# Altium footprint library Package_DFN_QFN.PcbLib: 557 footprints (part 5 of 35)
Each footprint in its own frame and in the unit in brackets; x right, y up, seen from the top. Pads: shape width x height; smd on the part's side, far side on the other; paste and mask are expansions set on the pad; w line width, h text height; cw(c..) or ccw(c..) is an arc to the next point about the centre after c.
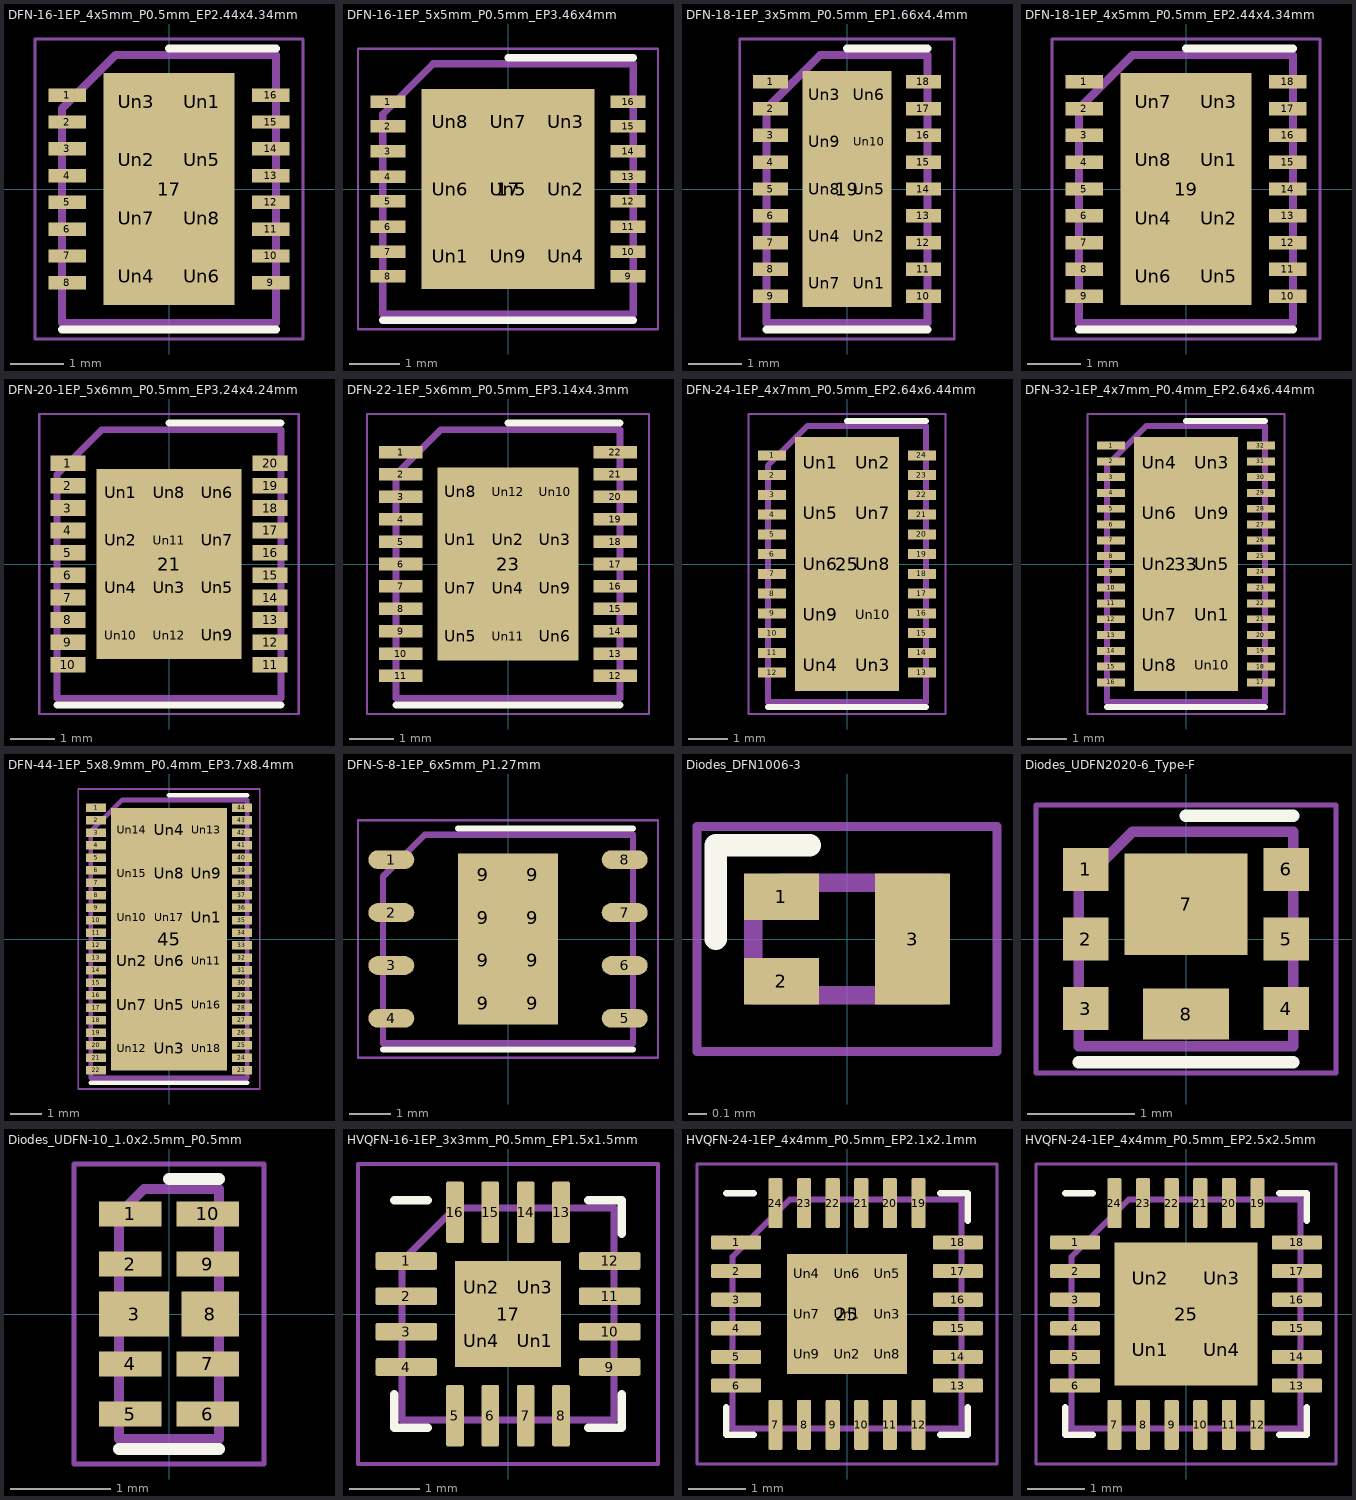
[diagram p4: the footprints below, top view; thin cyan lines are the x and y axes]

## DFN-16-1EP_4x5mm_P0.5mm_EP2.44x4.34mm [mm]
pads (25):
  rect 0.7x0.25 smd: 1(-1.9,1.75) 2(-1.9,1.25) 3(-1.9,0.75) 4(-1.9,0.25) 5(-1.9,-0.25) 6(-1.9,-0.75) 7(-1.9,-1.25) 8(-1.9,-1.75) 9(1.9,-1.75) 10(1.9,-1.25) 11(1.9,-0.75) 12(1.9,-0.25) 13(1.9,0.25) 14(1.9,0.75) 15(1.9,1.25) 16(1.9,1.75)
  rect 2.44x4.34 smd: 17(0,0)
  rect 1x0.86 on Top Paste: Un1(0.61,1.627) Un2(-0.61,0.543) Un3(-0.61,1.627) Un4(-0.61,-1.627) Un5(0.61,0.543) Un6(0.61,-1.627) Un7(-0.61,-0.543) Un8(0.61,-0.543)
F.SilkS:
  lines w0.15: -2,-2.625 2,-2.625 ; 0,2.625 2,2.625
F.CrtYd:
  lines w0.05: -2.5,-2.8 -2.5,2.8 2.5,2.8 2.5,-2.8 -2.5,-2.8
F.Fab:
  lines w0.15: -2,-2.5 -2,1.5 -1,2.5 2,2.5 2,-2.5 -2,-2.5
  text "'.Designator'" at -4.047,-0.84 h1

## DFN-16-1EP_5x5mm_P0.5mm_EP3.46x4mm [mm]
pads (26):
  rect 0.7x0.25 smd: 1(-2.4,1.75) 2(-2.4,1.25) 3(-2.4,0.75) 4(-2.4,0.25) 5(-2.4,-0.25) 6(-2.4,-0.75) 7(-2.4,-1.25) 8(-2.4,-1.75) 9(2.4,-1.75) 10(2.4,-1.25) 11(2.4,-0.75) 12(2.4,-0.25) 13(2.4,0.25) 14(2.4,0.75) 15(2.4,1.25) 16(2.4,1.75)
  rect 3.46x4 smd: 17(0,0)
  rect 0.9x1.1 on Top Paste: Un1(-1.154,-1.34) Un2(1.154,0) Un3(1.154,1.34) Un4(1.154,-1.34) Un5(0,0) Un6(-1.154,0) Un7(0,1.34) Un8(-1.154,1.34) Un9(0,-1.34)
F.SilkS:
  lines w0.15: -2.5,-2.625 2.5,-2.625 ; 0,2.625 2.5,2.625
F.CrtYd:
  lines w0.05: -3,-2.8 -3,2.8 3,2.8 3,-2.8 -3,-2.8
F.Fab:
  lines w0.15: -2.5,-2.5 -2.5,1.5 -1.5,2.5 2.5,2.5 2.5,-2.5 -2.5,-2.5
  text "'.Designator'" at -4.047,-0.84 h1

## DFN-18-1EP_3x5mm_P0.5mm_EP1.66x4.4mm [mm]
pads (29):
  rect 0.65x0.25 smd: 1(-1.425,2) 2(-1.425,1.5) 3(-1.425,1) 4(-1.425,0.5) 5(-1.425,0) 6(-1.425,-0.5) 7(-1.425,-1) 8(-1.425,-1.5) 9(-1.425,-2) 10(1.425,-2) 11(1.425,-1.5) 12(1.425,-1) 13(1.425,-0.5) 14(1.425,0) 15(1.425,0.5) 16(1.425,1) 17(1.425,1.5) 18(1.425,2)
  rect 1.66x4.4 smd: 19(0,0)
  rect 0.67x0.71 on Top Paste: Un1(0.415,-1.76) Un2(0.415,-0.88) Un3(-0.415,1.76) Un4(-0.415,-0.88) Un5(0.415,0) Un6(0.415,1.76) Un7(-0.415,-1.76) Un8(-0.415,0) Un9(-0.415,0.88) Un10(0.415,0.88)
F.SilkS:
  lines w0.15: -1.5,-2.625 1.5,-2.625 ; 0,2.625 1.5,2.625
F.CrtYd:
  lines w0.05: -2,-2.8 2,-2.8 2,2.8 -2,2.8 -2,-2.8
F.Fab:
  lines w0.15: -1.5,-2.5 -1.5,1.5 -0.5,2.5 1.5,2.5 1.5,-2.5 -1.5,-2.5
  text "'.Designator'" at 0.588,-2.833 h0.7

## DFN-18-1EP_4x5mm_P0.5mm_EP2.44x4.34mm [mm]
pads (27):
  rect 0.7x0.25 smd: 1(-1.9,2) 2(-1.9,1.5) 3(-1.9,1) 4(-1.9,0.5) 5(-1.9,0) 6(-1.9,-0.5) 7(-1.9,-1) 8(-1.9,-1.5) 9(-1.9,-2) 10(1.9,-2) 11(1.9,-1.5) 12(1.9,-1) 13(1.9,-0.5) 14(1.9,0) 15(1.9,0.5) 16(1.9,1) 17(1.9,1.5) 18(1.9,2)
  rect 2.44x4.34 smd: 19(0,0)
  rect 1x0.86 on Top Paste: Un1(0.61,0.543) Un2(0.61,-0.543) Un3(0.61,1.627) Un4(-0.61,-0.543) Un5(0.61,-1.627) Un6(-0.61,-1.627) Un7(-0.61,1.627) Un8(-0.61,0.543)
F.SilkS:
  lines w0.15: -2,-2.625 2,-2.625 ; 0,2.625 2,2.625
F.CrtYd:
  lines w0.05: -2.5,-2.8 -2.5,2.8 2.5,2.8 2.5,-2.8 -2.5,-2.8
F.Fab:
  lines w0.15: -2,-2.5 2,-2.5 2,2.5 -1,2.5 -2,1.5 -2,-2.5
  text "'.Designator'" at -4.047,-0.84 h1

## DFN-20-1EP_5x6mm_P0.5mm_EP3.24x4.24mm [mm]
pads (33):
  rect 0.78x0.35 smd: 1(-2.26,2.25) 2(-2.26,1.75) 3(-2.26,1.25) 4(-2.26,0.75) 5(-2.26,0.25) 6(-2.26,-0.25) 7(-2.26,-0.75) 8(-2.26,-1.25) 9(-2.26,-1.75) 10(-2.26,-2.25) 11(2.26,-2.25) 12(2.26,-1.75) 13(2.26,-1.25) 14(2.26,-0.75) 15(2.26,-0.25) 16(2.26,0.25) 17(2.26,0.75) 18(2.26,1.25) 19(2.26,1.75) 20(2.26,2.25)
  rect 3.24x4.24 smd: 21(0,0)
  rect 0.86x0.86 on Top Paste: Un1(-1.08,1.59) Un2(-1.08,0.53) Un3(0,-0.53) Un4(-1.08,-0.53) Un5(1.08,-0.53) Un6(1.08,1.59) Un7(1.08,0.53) Un8(0,1.59) Un9(1.08,-1.59) Un10(-1.08,-1.59) Un11(0,0.53) Un12(0,-1.59)
F.SilkS:
  lines w0.15: -2.5,-3.15 2.5,-3.15 ; 0,3.15 2.5,3.15
F.CrtYd:
  lines w0.05: -2.9,-3.35 2.9,-3.35 2.9,3.35 -2.9,3.35 -2.9,-3.35
F.Fab:
  lines w0.15: -2.5,-3 -2.5,2 -1.5,3 2.5,3 2.5,-3 -2.5,-3
  text "'.Designator'" at -4.047,-0.84 h1

## DFN-22-1EP_5x6mm_P0.5mm_EP3.14x4.3mm [mm]
pads (35):
  rect 0.98x0.28 smd: 1(-2.395,2.5) 2(-2.395,2) 3(-2.395,1.5) 4(-2.395,1) 5(-2.395,0.5) 6(-2.395,0) 7(-2.395,-0.5) 8(-2.395,-1) 9(-2.395,-1.5) 10(-2.395,-2) 11(-2.395,-2.5) 12(2.395,-2.5) 13(2.395,-2) 14(2.395,-1.5) 15(2.395,-1) 16(2.395,-0.5) 17(2.395,0) 18(2.395,0.5) 19(2.395,1) 20(2.395,1.5) 21(2.395,2) 22(2.395,2.5)
  rect 3.14x4.3 smd: 23(0,0)
  rect 0.855x0.855 on Top Paste: Un1(-1.05,0.537) Un2(0,0.537) Un3(1.05,0.537) Un4(0,-0.537) Un5(-1.05,-1.613) Un6(1.05,-1.613) Un7(-1.05,-0.537) Un8(-1.05,1.613) Un9(1.05,-0.537) Un10(1.05,1.613) Un11(0,-1.613) Un12(0,1.613)
F.SilkS:
  lines w0.15: -2.5,-3.15 2.5,-3.15 ; 0,3.15 2.5,3.15
F.CrtYd:
  lines w0.05: -3.15,-3.35 -3.15,3.35 3.15,3.35 3.15,-3.35 -3.15,-3.35
F.Fab:
  lines w0.15: -2.5,-3 -2.5,2 -1.5,3 2.5,3 2.5,-3 -2.5,-3
  text "'.Designator'" at -4.047,-0.84 h1

## DFN-24-1EP_4x7mm_P0.5mm_EP2.64x6.44mm [mm]
pads (35):
  rect 0.7x0.25 smd: 1(-1.9,2.75) 2(-1.9,2.25) 3(-1.9,1.75) 4(-1.9,1.25) 5(-1.9,0.75) 6(-1.9,0.25) 7(-1.9,-0.25) 8(-1.9,-0.75) 9(-1.9,-1.25) 10(-1.9,-1.75) 11(-1.9,-2.25) 12(-1.9,-2.75) 13(1.9,-2.75) 14(1.9,-2.25) 15(1.9,-1.75) 16(1.9,-1.25) 17(1.9,-0.75) 18(1.9,-0.25) 19(1.9,0.25) 20(1.9,0.75) 21(1.9,1.25) 22(1.9,1.75) 23(1.9,2.25) 24(1.9,2.75)
  rect 2.64x6.44 smd: 25(0,0)
  rect 1.05x1.05 on Top Paste: Un1(-0.66,2.56) Un2(0.66,2.56) Un3(0.66,-2.56) Un4(-0.66,-2.56) Un5(-0.66,1.28) Un6(-0.66,0) Un7(0.66,1.28) Un8(0.66,0) Un9(-0.66,-1.28) Un10(0.66,-1.28)
F.SilkS:
  lines w0.15: -2,-3.625 2,-3.625 ; 0,3.625 2,3.625
F.CrtYd:
  lines w0.05: -2.5,-3.8 -2.5,3.8 2.5,3.8 2.5,-3.8 -2.5,-3.8
F.Fab:
  lines w0.15: -2,-3.5 2,-3.5 2,3.5 -1,3.5 -2,2.5 -2,-3.5
  text "'.Designator'" at -4.047,-0.84 h1

## DFN-32-1EP_4x7mm_P0.4mm_EP2.64x6.44mm [mm]
pads (43):
  rect 0.7x0.2 smd: 1(-1.9,3) 2(-1.9,2.6) 3(-1.9,2.2) 4(-1.9,1.8) 5(-1.9,1.4) 6(-1.9,1) 7(-1.9,0.6) 8(-1.9,0.2) 9(-1.9,-0.2) 10(-1.9,-0.6) 11(-1.9,-1) 12(-1.9,-1.4) 13(-1.9,-1.8) 14(-1.9,-2.2) 15(-1.9,-2.6) 16(-1.9,-3) 17(1.9,-3) 18(1.9,-2.6) 19(1.9,-2.2) 20(1.9,-1.8) 21(1.9,-1.4) 22(1.9,-1) 23(1.9,-0.6) 24(1.9,-0.2) 25(1.9,0.2) 26(1.9,0.6) 27(1.9,1) 28(1.9,1.4) 29(1.9,1.8) 30(1.9,2.2) 31(1.9,2.6) 32(1.9,3)
  rect 2.64x6.44 smd: 33(0,0)
  rect 1.05x1.05 on Top Paste: Un1(0.66,-1.28) Un2(-0.66,0) Un3(0.66,2.56) Un4(-0.66,2.56) Un5(0.66,0) Un6(-0.66,1.28) Un7(-0.66,-1.28) Un8(-0.66,-2.56) Un9(0.66,1.28) Un10(0.66,-2.56)
F.SilkS:
  lines w0.15: -2,-3.625 2,-3.625 ; 0,3.625 2,3.625
F.CrtYd:
  lines w0.05: -2.5,-3.8 2.5,-3.8 2.5,3.8 -2.5,3.8 -2.5,-3.8
F.Fab:
  lines w0.15: -2,-3.5 -2,2.5 -1,3.5 2,3.5 2,-3.5 -2,-3.5
  text "'.Designator'" at -4.047,-0.84 h1

## DFN-44-1EP_5x8.9mm_P0.4mm_EP3.7x8.4mm [mm]
pads (63):
  rect 0.63x0.26 smd: 1(-2.335,4.2) 2(-2.335,3.8) 3(-2.335,3.4) 4(-2.335,3) 5(-2.335,2.6) 6(-2.335,2.2) 7(-2.335,1.8) 8(-2.335,1.4) 9(-2.335,1) 10(-2.335,0.6) 11(-2.335,0.2) 12(-2.335,-0.2) 13(-2.335,-0.6) 14(-2.335,-1) 15(-2.335,-1.4) 16(-2.335,-1.8) 17(-2.335,-2.2) 18(-2.335,-2.6) 19(-2.335,-3) 20(-2.335,-3.4) 21(-2.335,-3.8) 22(-2.335,-4.2) 23(2.335,-4.2) 24(2.335,-3.8) 25(2.335,-3.4) 26(2.335,-3) 27(2.335,-2.6) 28(2.335,-2.2) 29(2.335,-1.8) 30(2.335,-1.4) 31(2.335,-1) 32(2.335,-0.6) 33(2.335,-0.2) 34(2.335,0.2) 35(2.335,0.6) 36(2.335,1) 37(2.335,1.4) 38(2.335,1.8) 39(2.335,2.2) 40(2.335,2.6) 41(2.335,3) 42(2.335,3.4) 43(2.335,3.8) 44(2.335,4.2)
  rect 3.7x8.4 smd: 45(0,0)
  rect 0.98x1.15 on Top Paste: Un1(1.2,0.7) Un2(-1.2,-0.7) Un3(0,-3.5) Un4(0,3.5) Un5(0,-2.1) Un6(0,-0.7) Un7(-1.2,-2.1) Un8(0,2.1) Un9(1.2,2.1) Un10(-1.2,0.7) Un11(1.2,-0.7) Un12(-1.2,-3.5) Un13(1.2,3.5) Un14(-1.2,3.5) Un15(-1.2,2.1) Un16(1.2,-2.1) Un17(0,0.7) Un18(1.2,-3.5)
F.SilkS:
  lines w0.15: -2.5,-4.6 2.5,-4.6 ; 0,4.6 2.5,4.6
F.CrtYd:
  lines w0.05: -2.9,-4.8 2.9,-4.8 2.9,4.8 -2.9,4.8 -2.9,-4.8
F.Fab:
  lines w0.15: -2.5,-4.45 -2.5,3.45 -1.5,4.45 2.5,4.45 2.5,-4.45 -2.5,-4.45
  text "'.Designator'" at -4.047,-0.84 h1

## DFN-S-8-1EP_6x5mm_P1.27mm [mm]
pads (16):
  rrect100% 1.1x0.45 smd: 1(-2.8,1.905) 2(-2.8,0.635) 3(-2.8,-0.635) 4(-2.8,-1.905) 5(2.8,-1.905) 6(2.8,-0.635) 7(2.8,0.635) 8(2.8,1.905)
  rect 1.2x1.025 smd: 9(-0.6,-1.538) 9(-0.6,-0.512) 9(-0.6,0.513) 9(-0.6,1.538) 9(0.6,-1.538) 9(0.6,-0.512) 9(0.6,0.513) 9(0.6,1.538)
F.SilkS:
  lines w0.15: -3,-2.65 3,-2.65 ; -1.2,2.65 3,2.65
F.CrtYd:
  lines w0.05: -3.6,-2.85 -3.6,2.85 3.6,2.85 3.6,-2.85 -3.6,-2.85
F.Fab:
  lines w0.15: -3,-2.5 3,-2.5 3,2.5 -2,2.5 -3,1.5 -3,-2.5
  text "'.Designator'" at -4.047,-0.84 h1

## Diodes_DFN1006-3 [mm]
pads (3):
  rect 0.4x0.25 smd: 1(-0.35,0.225) 2(-0.35,-0.225)
  rect 0.4x0.7 smd: 3(0.35,0)
F.SilkS:
  lines w0.12: -0.7,0 -0.7,0.5 -0.2,0.5
F.CrtYd:
  lines w0.05: -0.8,-0.6 0.8,-0.6 0.8,0.6 -0.8,0.6 -0.8,-0.6
F.Fab:
  lines w0.1: -0.5,-0.3 0.5,-0.3 0.5,0.3 -0.35,0.3 -0.5,0.15 -0.5,-0.3
  text "'.Designator'" at -4.047,0.76 h1

## Diodes_UDFN2020-6_Type-F [mm]
pads (8):
  rect 0.425x0.4 smd: 1(-0.937,0.65) 2(-0.937,0) 3(-0.937,-0.65) 4(0.937,-0.65) 5(0.937,0) 6(0.937,0.65)
  rect 1.15x0.95 smd: 7(0,0.325)
  rect 0.8x0.48 smd: 8(0,-0.7)
F.SilkS:
  lines w0.12: -1,-1.15 1,-1.15 ; 0,1.15 1,1.15
F.CrtYd:
  lines w0.05: -1.4,-1.25 -1.4,1.25 1.4,1.25 1.4,-1.25 -1.4,-1.25
F.Fab:
  lines w0.1: -1,-1 1,-1 1,1 -0.5,1 -1,0.5 -1,-1
  text "'.Designator'" at -1.219,-0.357 h0.3

## Diodes_UDFN-10_1.0x2.5mm_P0.5mm [mm]
pads (10):
  rect 0.625x0.25 smd: 1(-0.387,1) 2(-0.387,0.5) 4(-0.387,-0.5) 5(-0.387,-1) 6(0.387,-1) 7(0.387,-0.5) 9(0.387,0.5) 10(0.387,1)
  rect 0.7x0.45 smd: 3(-0.35,0)
  rect 0.575x0.45 smd: 8(0.413,0)
F.SilkS:
  lines w0.12: -0.5,-1.35 0.5,-1.35 ; 0,1.35 0.5,1.35
F.CrtYd:
  lines w0.05: -0.95,-1.5 -0.95,1.5 0.95,1.5 0.95,-1.5 -0.95,-1.5
F.Fab:
  lines w0.1: -0.5,-1.25 -0.5,1 -0.25,1.25 0.5,1.25 0.5,-1.25 -0.5,-1.25
  text "'.Designator'" at 0.48,-2.243 h0.55

## HVQFN-16-1EP_3x3mm_P0.5mm_EP1.5x1.5mm [mm]
pads (21):
  rrect25% 0.875x0.25 smd: 1(-1.438,0.75) 2(-1.438,0.25) 3(-1.438,-0.25) 4(-1.438,-0.75) 9(1.438,-0.75) 10(1.438,-0.25) 11(1.438,0.25) 12(1.438,0.75)
  rrect25% 0.25x0.875 smd: 5(-0.75,-1.438) 6(-0.25,-1.438) 7(0.25,-1.438) 8(0.75,-1.438) 13(0.75,1.438) 14(0.25,1.438) 15(-0.25,1.438) 16(-0.75,1.438)
  rect 1.5x1.5 smd: 17(0,0)
  rrect25% 0.6x0.6 on Top Paste: Un1(0.375,-0.375) Un2(-0.375,0.375) Un3(0.375,0.375) Un4(-0.375,-0.375)
F.SilkS:
  lines w0.12: -1.61,-1.135 -1.61,-1.61 -1.135,-1.61 ; -1.61,1.61 -1.135,1.61 ; 1.135,-1.61 1.61,-1.61 1.61,-1.135 ; 1.135,1.61 1.61,1.61 1.61,1.135
F.CrtYd:
  lines w0.05: -2.12,-2.12 2.12,-2.12 2.12,2.12 -2.12,2.12 -2.12,-2.12
F.Fab:
  lines w0.1: -1.5,-1.5 1.5,-1.5 1.5,1.5 -0.75,1.5 -1.5,0.75 -1.5,-1.5
  text "'.Designator'" at -3.033,-0.628 h0.75

## HVQFN-24-1EP_4x4mm_P0.5mm_EP2.1x2.1mm [mm]
pads (34):
  rrect25% 0.875x0.25 smd: 1(-1.937,1.25) 2(-1.937,0.75) 3(-1.937,0.25) 4(-1.937,-0.25) 5(-1.937,-0.75) 6(-1.937,-1.25) 13(1.937,-1.25) 14(1.937,-0.75) 15(1.937,-0.25) 16(1.937,0.25) 17(1.937,0.75) 18(1.937,1.25)
  rrect25% 0.25x0.875 smd: 7(-1.25,-1.937) 8(-0.75,-1.937) 9(-0.25,-1.937) 10(0.25,-1.937) 11(0.75,-1.937) 12(1.25,-1.937) 19(1.25,1.937) 20(0.75,1.937) 21(0.25,1.937) 22(-0.25,1.937) 23(-0.75,1.937) 24(-1.25,1.937)
  rect 2.1x2.1 smd: 25(0,0)
  rrect25% 0.56x0.56 on Top Paste: Un1(0,0) Un2(0,-0.7) Un3(0.7,0) Un4(-0.7,0.7) Un5(0.7,0.7) Un6(0,0.7) Un7(-0.7,0) Un8(0.7,-0.7) Un9(-0.7,-0.7)
F.SilkS:
  lines w0.12: -2.11,-1.635 -2.11,-2.11 -1.635,-2.11 ; -2.11,2.11 -1.635,2.11 ; 1.635,-2.11 2.11,-2.11 2.11,-1.635 ; 1.635,2.11 2.11,2.11 2.11,1.635
F.CrtYd:
  lines w0.05: -2.62,-2.62 2.62,-2.62 2.62,2.62 -2.62,2.62 -2.62,-2.62
F.Fab:
  lines w0.1: -2,-2 2,-2 2,2 -1,2 -2,1 -2,-2
  text "'.Designator'" at -4.047,-0.84 h1

## HVQFN-24-1EP_4x4mm_P0.5mm_EP2.5x2.5mm [mm]
pads (29):
  rrect25% 0.875x0.25 smd: 1(-1.937,1.25) 2(-1.937,0.75) 3(-1.937,0.25) 4(-1.937,-0.25) 5(-1.937,-0.75) 6(-1.937,-1.25) 13(1.937,-1.25) 14(1.937,-0.75) 15(1.937,-0.25) 16(1.937,0.25) 17(1.937,0.75) 18(1.937,1.25)
  rrect25% 0.25x0.875 smd: 7(-1.25,-1.937) 8(-0.75,-1.937) 9(-0.25,-1.937) 10(0.25,-1.937) 11(0.75,-1.937) 12(1.25,-1.937) 19(1.25,1.937) 20(0.75,1.937) 21(0.25,1.937) 22(-0.25,1.937) 23(-0.75,1.937) 24(-1.25,1.937)
  rect 2.5x2.5 smd: 25(0,0)
  rrect25% 1.01x1.01 on Top Paste: Un1(-0.625,-0.625) Un2(-0.625,0.625) Un3(0.625,0.625) Un4(0.625,-0.625)
F.SilkS:
  lines w0.12: -2.11,-1.635 -2.11,-2.11 -1.635,-2.11 ; -2.11,2.11 -1.635,2.11 ; 1.635,-2.11 2.11,-2.11 2.11,-1.635 ; 1.635,2.11 2.11,2.11 2.11,1.635
F.CrtYd:
  lines w0.05: -2.62,-2.62 2.62,-2.62 2.62,2.62 -2.62,2.62 -2.62,-2.62
F.Fab:
  lines w0.1: -2,-2 -2,1 -1,2 2,2 2,-2 -2,-2
  text "'.Designator'" at -4.047,-0.84 h1